# Altium footprint library 400389.PcbLib: 91 footprints (part 3 of 6)
Each footprint in its own frame and in the unit in brackets; x right, y up, seen from the top. Pads: shape width x height; smd on the part's side, far side on the other; paste and mask are expansions set on the pad; w line width, h text height; cw(c..) or ccw(c..) is an arc to the next point about the centre after c.
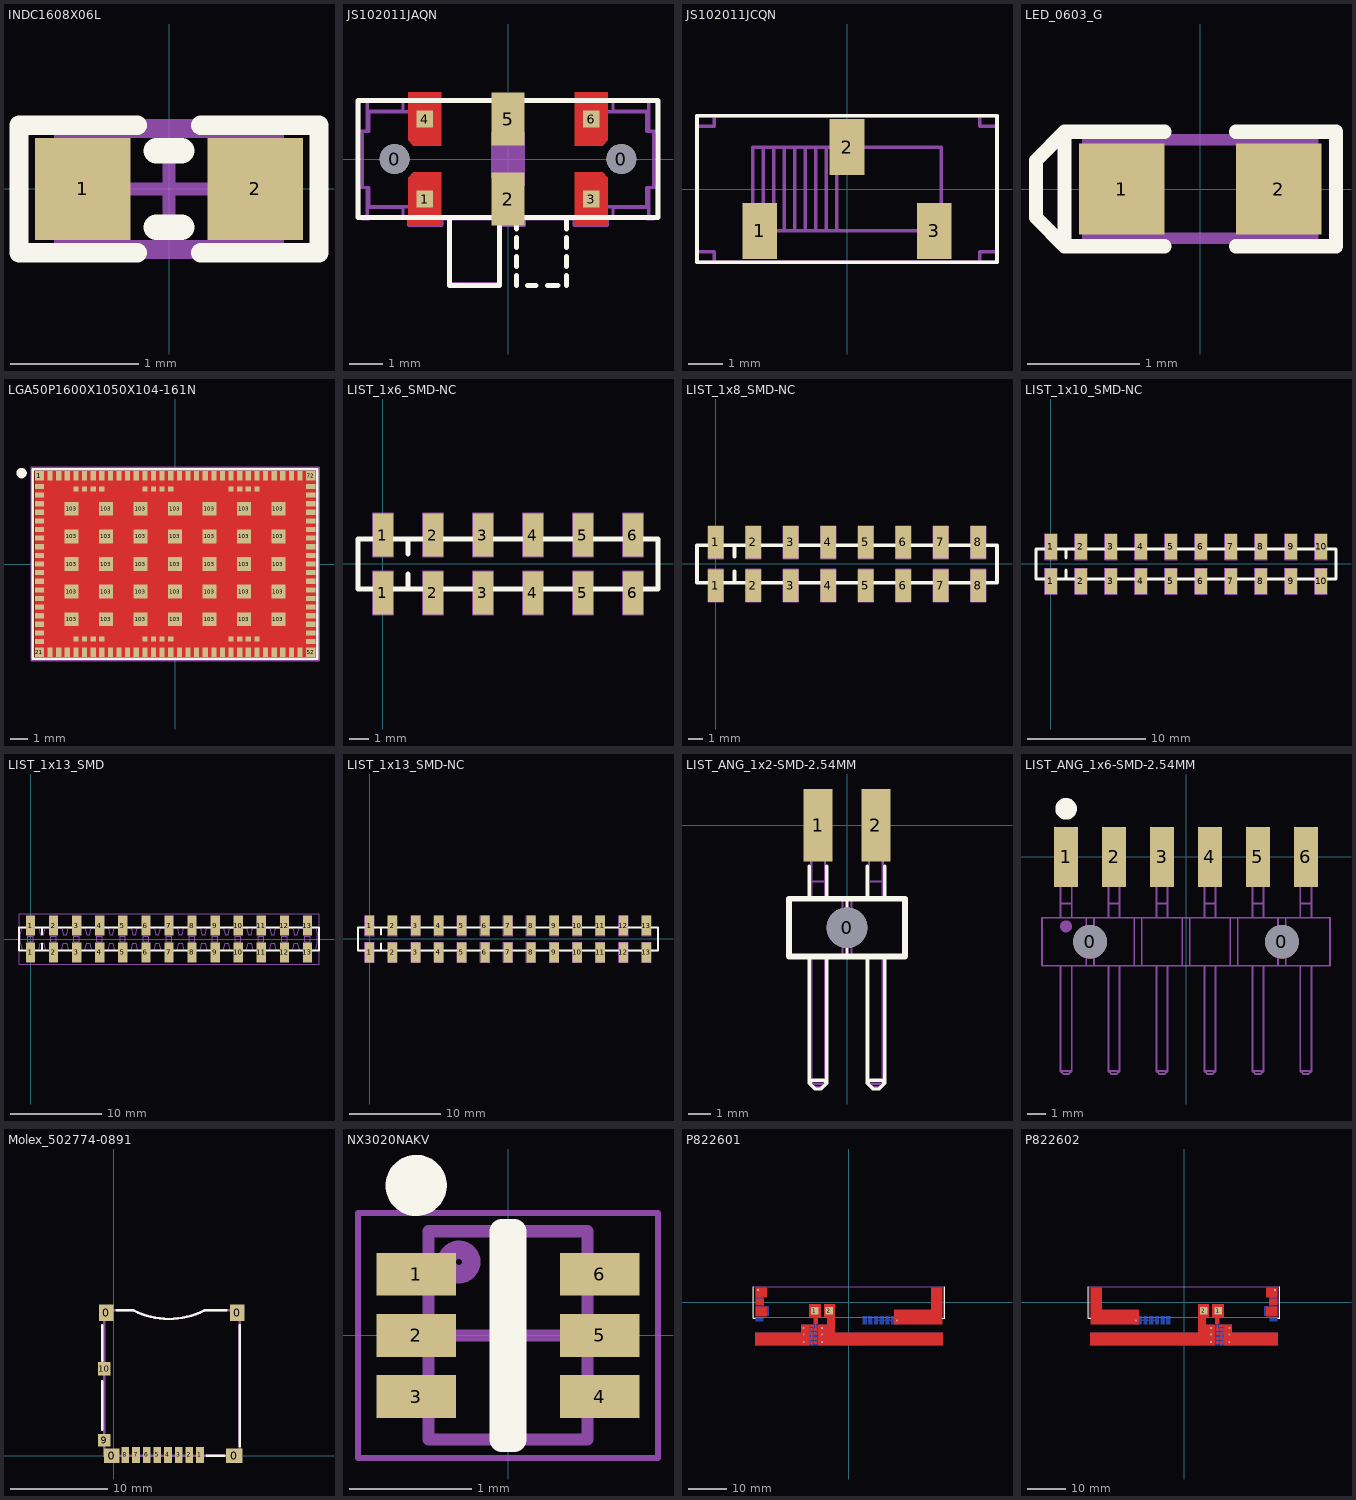
[diagram p2: the footprints below, top view; thin cyan lines are the x and y axes]

## INDC1608X06L [mm]
pads (2):
  rect 0.75x0.8 smd: 1(-0.675,0) 2(0.675,0)
Top Overlay:
  lines w0.152: -0.25,-0.5 -1.175,-0.5 -1.175,0.5 -0.25,0.5 ; 0.25,-0.5 1.175,-0.5 1.175,0.5 0.25,0.5
  lines w0.2: -0.1,-0.3 0.1,-0.3 ; -0.1,0.3 0.1,0.3
Mechanical 7:
  lines w0.1: -0.85,-0.45 0.85,-0.45 0.85,0.45 -0.85,0.45 -0.85,-0.45
  text ".Designator" at -0.711,-0.152 h0.3
Mechanical 15:
  lines w0.1: -0.45,0 0.45,0 ; 0,-0.45 0,0.45 ; -1.175,-0.5 -1.175,0.5 1.175,0.5 1.175,-0.5 -1.175,-0.5
3D body "User Library-Chip Inductor.step": height 0.8, standoff 0, extent -0.8,-0.475 0.8,0.475

## JS102011JAQN [mm]
pads (8):
  round 0.9 hole 0.9 unplated mask+0: 0(-3.4,0) 0(3.4,0)
  rect 0.5x0.5 smd: 1(-2.5,-1.2) 3(2.5,-1.2) 4(-2.5,1.2) 6(2.5,1.2)
  rect 1x1.6 smd: 2(0,-1.2) 5(0,1.2)
Top Layer:
  region: -3,0.562 -2.838,0.4 -2,0.4 -2,2 -3,2
  region: -3,-0.562 -2.838,-0.4 -2,-0.4 -2,-2 -3,-2
  region: 3,0.562 2.838,0.4 2,0.4 2,2 3,2
  region: 3,-0.562 2.838,-0.4 2,-0.4 2,-2 3,-2
Top Overlay:
  lines w0.152: -1.75,-1.75 -1.75,-3.8 -0.25,-3.8 -0.25,-1.75 ; 0.25,-3.8 0.25,-3.5 ; 0.25,-3.22 0.25,-2.92 ; 0.25,-2.66 0.25,-2.36 ; 0.25,-2.1 0.25,-1.75 ; 0.59,-3.8 0.84,-3.8 ; 1.19,-3.8 1.44,-3.8 ; 1.2,-3.8 1.5,-3.8 ; 1.75,-3.8 1.75,-3.5 ; 1.75,-3.22 1.75,-2.92 ; 1.75,-2.66 1.75,-2.36 ; 1.75,-2.1 1.75,-1.75 ; -4.5,-1.75 -4.5,1.75 4.5,1.75 4.5,-1.75 -4.5,-1.75
Mechanical 7:
  region: -0.5,-0.554 -0.254,-0.8 0.5,-0.8 0.5,0.8 -0.5,0.8
  lines w0.1: -4.376,-1.747 -4.376,-1.797 -4.174,-1.797 -4.174,-1.747 ; -4.376,1.731 -4.376,1.781 -4.174,1.781 -4.174,1.731 ; -4.224,-1.747 -4.224,-0.853 ; -4.224,-1.449 -3.151,-1.449 -3.151,-1.747 ; -4.224,0.836 -4.224,1.731 ; -4.224,1.433 -3.151,1.433 -3.151,1.731 ; -2.982,-1.747 -2.982,-1.996 -1.988,-1.996 -1.988,-1.797 ; -2.783,-1.747 -2.783,-1.797 -2.772,-1.797 ; -2.783,1.731 -2.783,1.781 -2.772,1.781 ; -2.772,-1.747 -4.472,-1.747 -4.472,-0.853 -4.376,-0.853 ; -2.772,1.731 -4.472,1.731 -4.472,0.836 -4.376,0.836 ; -1.74,-1.797 -1.74,-3.735 -0.249,-3.735 -0.249,-1.797 ; -0.249,-1.996 0.496,-1.996 0.496,-1.797 ; 1.987,-1.797 1.987,-1.996 2.981,-1.996 2.981,-1.747 ; 2.77,-1.747 4.471,-1.747 4.471,-0.853 4.375,-0.853 ; 2.77,1.731 4.471,1.731 4.471,0.836 4.375,0.836 ; 2.782,-1.747 2.782,-1.797 2.77,-1.797 ; 2.782,1.731 2.782,1.781 2.77,1.781 ; 3.149,-1.747 3.149,-1.449 4.223,-1.449 ; 3.149,1.731 3.149,1.433 4.223,1.433 ; 4.173,-1.747 4.173,-1.797 4.375,-1.797 4.375,-1.747 ; 4.173,1.731 4.173,1.781 4.375,1.781 4.375,1.731 ; 4.223,-1.747 4.223,-0.853 ; 4.223,0.836 4.223,1.731 ; -4.376,-0.853 -4.376,0.836 ; -4.376,-0.853 -4.168,-0.853 -4.168,-1.434 -2.772,-1.434 -2.772,-1.797 ; -4.376,0.836 -4.168,0.836 -4.168,1.418 -2.772,1.418 -2.772,1.781 ; -2.772,-1.797 2.77,-1.797 ; -2.772,1.781 2.77,1.781 ; 2.77,-1.797 2.77,-1.434 4.166,-1.434 4.166,-0.853 4.375,-0.853 ; 2.77,1.781 2.77,1.418 4.166,1.418 4.166,0.836 4.375,0.836 ; 4.375,-0.853 4.375,0.836
  text ".Designator" at -0.9,-0.2 h0.38
3D body "CL-SB-22A-11T.stp": height 3.5, standoff 0, extent -4.25,-3.75 4.25,1.75

## JS102011JCQN [mm]
pads (3):
  rect 1x1.6 smd: 1(-2.5,-1.2) 2(0,1.2) 3(2.5,-1.2)
Top Overlay:
  lines w0.102: -4.3,-2.1 4.3,-2.1 4.3,2.1 -4.3,2.1 -4.3,-2.1
Mechanical 7:
  lines w0.1: -4.3,-1.8 -3.8,-1.8 -3.8,-2.1 ; -4.3,1.8 -3.8,1.8 -3.8,2.1 ; 3.8,-2.1 3.8,-1.8 4.3,-1.8 ; 3.8,2.1 3.8,1.8 4.3,1.8
  lines w0.102: -4.3,-1.8 -4.3,1.8 ; -3.8,-2.1 3.8,-2.1 ; -3.8,2.1 3.8,2.1 ; -2.4,-1.2 -2.4,1.2 ; -2.1,-1.2 -2.1,1.2 ; -1.8,-1.2 -1.8,1.2 ; -1.5,-1.2 -1.5,1.2 ; -1.2,-1.2 -1.2,1.2 ; -0.9,-1.2 -0.9,1.2 ; -0.6,-1.2 -0.6,1.2 ; -0.3,-1.2 -0.3,1.2 ; 4.3,-1.8 4.3,1.8 ; -2.7,-1.2 2.7,-1.2 2.7,1.2 -2.7,1.2 -2.7,-1.2
  text ".Designator" at -1.7,-0.3 h0.76
Mechanical 15:
  lines w0.102: -4.3,-2.1 4.3,-2.1 4.3,2.1 -4.3,2.1 -4.3,-2.1
3D body "js102011jcqn.stp": height 5.22, standoff -0.38, extent -4.25,-2.05 4.25,2.05

## LED_0603_G [mil]
pads (2):
  rect 30x32 smd: 1(-27.5,0) 2(27.5,0)
Top Overlay:
  lines w5: -12.5,-20 -47.5,-20 ; -12.5,20 -47.5,20 ; 12.5,-20 47.5,-20 47.5,20 12.5,20 ; -47.5,-20 -47.5,20 ; -47.5,-20 -57.5,-10 -57.5,10 -47.5,20
Mechanical 7:
  lines w3.94: -27.56,-17.26 -27.56,17.26 ; -23.62,-17.26 -23.62,17.26 ; 23.62,-17.26 23.62,17.26 ; 27.56,-17.26 27.56,17.26 ; -39.37,-17.26 39.37,-17.26 39.37,17.26 -39.37,17.26 -39.37,-17.26
  text ".Designator" at -19.68,-4.92 h12
3D body "User Library-led_0603_green.step": height 23.62, standoff 0, extent -31.63,-15.75 32.15,15.75

## LGA50P1600X1050X104-161N [mm]
pads (161):
  rect 0.54x0.54 smd mask+0.05: 1(-7.87,5.12) 21(-7.87,-5.12) 52(7.87,-5.12) 72(7.87,5.12)
  rect 0.54x0.3 smd mask+0.05: 2(-7.87,4.5) 3(-7.87,4) 4(-7.87,3.5) 5(-7.87,3) 6(-7.87,2.5) 7(-7.87,2) 8(-7.87,1.5) 9(-7.87,1) 10(-7.87,0.5) 11(-7.87,0) 12(-7.87,-0.5) 13(-7.87,-1) 14(-7.87,-1.5) 15(-7.87,-2) 16(-7.87,-2.5) 17(-7.87,-3) 18(-7.87,-3.5) 19(-7.87,-4) 20(-7.87,-4.5) 53(7.87,-4.5) 54(7.87,-4) 55(7.87,-3.5) 56(7.87,-3) 57(7.87,-2.5) 58(7.87,-2) 59(7.87,-1.5) 60(7.87,-1) 61(7.87,-0.5) 62(7.87,0) 63(7.87,0.5) 64(7.87,1) 65(7.87,1.5) 66(7.87,2) 67(7.87,2.5) 68(7.87,3) 69(7.87,3.5) 70(7.87,4) 71(7.87,4.5)
  rect 0.3x0.54 smd mask+0.05: 22(-7.25,-5.12) 23(-6.75,-5.12) 24(-6.25,-5.12) 25(-5.75,-5.12) 26(-5.25,-5.12) 27(-4.75,-5.12) 28(-4.25,-5.12) 29(-3.75,-5.12) 30(-3.25,-5.12) 31(-2.75,-5.12) 32(-2.25,-5.12) 33(-1.75,-5.12) 34(-1.25,-5.12) 35(-0.75,-5.12) 36(-0.25,-5.12) 37(0.25,-5.12) 38(0.75,-5.12) 39(1.25,-5.12) 40(1.75,-5.12) 41(2.25,-5.12) 42(2.75,-5.12) 43(3.25,-5.12) 44(3.75,-5.12) 45(4.25,-5.12) 46(4.75,-5.12) 47(5.25,-5.12) 48(5.75,-5.12) 49(6.25,-5.12) 50(6.75,-5.12) 51(7.25,-5.12) 73(7.25,5.12) 74(6.75,5.12) 75(6.25,5.12) 76(5.75,5.12) 77(5.25,5.12) 78(4.75,5.12) 79(4.25,5.12) 80(3.75,5.12) 81(3.25,5.12) 82(2.75,5.12) 83(2.25,5.12) 84(1.75,5.12) 85(1.25,5.12) 86(0.75,5.12) 87(0.25,5.12) 88(-0.25,5.12) 89(-0.75,5.12) 90(-1.25,5.12) 91(-1.75,5.12) 92(-2.25,5.12) 93(-2.75,5.12) 94(-3.25,5.12) 95(-3.75,5.12) 96(-4.25,5.12) 97(-4.75,5.12) 98(-5.25,5.12) 99(-5.75,5.12) 100(-6.25,5.12) 101(-6.75,5.12) 102(-7.25,5.12)
  rect 0.8x0.8 smd mask+0.05: 103(-6,-3.2) 103(-6,-1.6) 103(-6,0) 103(-6,1.6) 103(-6,3.2) 103(-4,-3.2) 103(-4,-1.6) 103(-4,0) 103(-4,1.6) 103(-4,3.2) 103(-2,-3.2) 103(-2,-1.6) 103(-2,0) 103(-2,1.6) 103(-2,3.2) 103(0,-3.2) 103(0,-1.6) 103(0,0) 103(0,1.6) 103(0,3.2) 103(2,-3.2) 103(2,-1.6) 103(2,0) 103(2,1.6) 103(2,3.2) 103(4,-3.2) 103(4,-1.6) 103(4,0) 103(4,1.6) 103(4,3.2) 103(6,-3.2) 103(6,-1.6) 103(6,0) 103(6,1.6) 103(6,3.2)
  rect 0.3x0.3 smd mask+0.05: 104(-5.75,-4.35) 105(-5.25,-4.35) 106(-4.75,-4.35) 107(-4.25,-4.35) 108(-1.75,-4.35) 109(-1.25,-4.35) 110(-0.75,-4.35) 111(-0.25,-4.35) 112(3.25,-4.35) 113(3.75,-4.35) 114(4.25,-4.35) 115(4.75,-4.35) 116(4.75,4.35) 117(4.25,4.35) 118(3.75,4.35) 119(3.25,4.35) 120(-0.25,4.35) 121(-0.75,4.35) 122(-1.25,4.35) 123(-1.75,4.35) 124(-4.25,4.35) 125(-4.75,4.35) 126(-5.25,4.35) 127(-5.75,4.35)
Top Layer:
  pour cut-out: -8.15,5.4 8.15,5.4 8.15,-5.4 -8.15,-5.4
Top Overlay:
  circle w0.3: c-8.904,5.274 r0.15
  lines w0.15: -8.25,-5.5 -8.25,5.5 8.25,5.5 8.25,-5.5 -8.25,-5.5
Mechanical 7:
  circle w0.3: c-6.5,3.75 r0.15
  lines w0.1: -8.05,-5.3 -8.05,5.3 8.05,5.3 8.05,-5.3 -8.05,-5.3
  text ".Designator" at 0.5,-0.1 h0.38
Mechanical 15:
  circle w0.3: c-6.5,3.75 r0.15
  lines w0.1: -8.35,-5.6 8.35,-5.6 8.35,5.6 -8.35,5.6 -8.35,-5.6
3D body "nRF9160_v5.step": height 1.2, standoff 0, extent -8.05,-5.3 8.05,5.3

## LIST_1x6_SMD-NC [mm]
pads (12):
  rect 1.02x2.19 smd: 1(0,-1.465) 1(0,1.465) 2(2.54,-1.465) 2(2.54,1.465) 3(5.08,-1.465) 3(5.08,1.465) 4(7.62,-1.465) 4(7.62,1.465) 5(10.16,-1.465) 5(10.16,1.465) 6(12.7,-1.465) 6(12.7,1.465)
Top Overlay:
  lines w0.254: 1.27,-1.27 1.27,-0.508 ; 1.27,0.508 1.27,1.27 ; -1.27,-1.27 -1.27,1.27 13.97,1.27 13.97,-1.27 -1.27,-1.27
Mechanical 7:
  lines w0.1: -0.686,-1.27 -1.27,-1.27 -1.27,1.27 -0.686,1.27 ; 0.686,-1.27 1.854,-1.27 ; 0.686,1.27 1.854,1.27 ; 1.27,-1.27 1.27,-0.508 ; 1.27,0.508 1.27,1.27 ; 3.226,-1.27 4.394,-1.27 ; 3.226,1.27 4.394,1.27 ; 5.766,-1.27 6.934,-1.27 ; 5.766,1.27 6.934,1.27 ; 8.306,-1.27 9.474,-1.27 ; 8.306,1.27 9.474,1.27 ; 10.846,-1.27 12.014,-1.27 ; 10.846,1.27 12.014,1.27 ; 13.386,-1.27 13.97,-1.27 13.97,1.27 13.386,1.27 ; -0.51,-2.56 -0.51,-0.37 0.51,-0.37 0.51,-2.56 -0.51,-2.56 ; -0.51,0.37 0.51,0.37 0.51,2.56 -0.51,2.56 -0.51,0.37 ; 2.03,-2.56 2.03,-0.37 3.05,-0.37 3.05,-2.56 2.03,-2.56 ; 2.03,0.37 2.03,2.56 3.05,2.56 3.05,0.37 2.03,0.37 ; 4.57,-2.56 4.57,-0.37 5.59,-0.37 5.59,-2.56 4.57,-2.56 ; 4.57,0.37 4.57,2.56 5.59,2.56 5.59,0.37 4.57,0.37 ; 7.11,-2.56 7.11,-0.37 8.13,-0.37 8.13,-2.56 7.11,-2.56 ; 7.11,0.37 7.11,2.56 8.13,2.56 8.13,0.37 7.11,0.37 ; 9.65,-2.56 9.65,-0.37 10.67,-0.37 10.67,-2.56 9.65,-2.56 ; 9.65,0.37 9.65,2.56 10.67,2.56 10.67,0.37 9.65,0.37 ; 12.19,-2.56 12.19,-0.37 13.21,-0.37 13.21,-2.56 12.19,-2.56 ; 12.19,0.37 12.19,2.56 13.21,2.56 13.21,0.37 12.19,0.37
  text ".Designator" at 0.5,-0.2 h0.38

## LIST_1x8_SMD-NC [mm]
pads (16):
  rect 1.02x2.19 smd: 1(0,-1.465) 1(0,1.465) 2(2.54,-1.465) 2(2.54,1.465) 3(5.08,-1.465) 3(5.08,1.465) 4(7.62,-1.465) 4(7.62,1.465) 5(10.16,-1.465) 5(10.16,1.465) 6(12.7,-1.465) 6(12.7,1.465) 7(15.24,-1.465) 7(15.24,1.465) 8(17.78,-1.465) 8(17.78,1.465)
Top Overlay:
  lines w0.254: 1.27,-1.27 1.27,-0.508 ; 1.27,0.508 1.27,1.27 ; -1.27,-1.27 19.05,-1.27 19.05,1.27 -1.27,1.27 -1.27,-1.27
Mechanical 7:
  lines w0.1: -0.686,-1.27 -1.27,-1.27 -1.27,1.27 -0.686,1.27 ; 0.686,-1.27 1.854,-1.27 ; 0.686,1.27 1.854,1.27 ; 1.27,-1.27 1.27,-0.508 ; 1.27,0.508 1.27,1.27 ; 3.226,-1.27 4.394,-1.27 ; 3.226,1.27 4.394,1.27 ; 5.766,-1.27 6.934,-1.27 ; 5.766,1.27 6.934,1.27 ; 8.306,-1.27 9.474,-1.27 ; 8.306,1.27 9.474,1.27 ; 10.846,-1.27 12.014,-1.27 ; 10.846,1.27 12.014,1.27 ; 13.386,-1.27 14.554,-1.27 ; 13.386,1.27 14.554,1.27 ; 15.926,-1.27 17.094,-1.27 ; 15.926,1.27 17.094,1.27 ; 18.466,-1.27 19.05,-1.27 19.05,1.27 18.466,1.27 ; -0.51,-2.56 0.51,-2.56 0.51,-0.37 -0.51,-0.37 -0.51,-2.56 ; -0.51,0.37 -0.51,2.56 0.51,2.56 0.51,0.37 -0.51,0.37 ; 2.03,-2.56 3.05,-2.56 3.05,-0.37 2.03,-0.37 2.03,-2.56 ; 2.03,0.37 3.05,0.37 3.05,2.56 2.03,2.56 2.03,0.37 ; 4.57,-2.56 5.59,-2.56 5.59,-0.37 4.57,-0.37 4.57,-2.56 ; 4.57,0.37 5.59,0.37 5.59,2.56 4.57,2.56 4.57,0.37 ; 7.11,-2.56 8.13,-2.56 8.13,-0.37 7.11,-0.37 7.11,-2.56 ; 7.11,0.37 8.13,0.37 8.13,2.56 7.11,2.56 7.11,0.37 ; 9.65,-2.56 10.67,-2.56 10.67,-0.37 9.65,-0.37 9.65,-2.56 ; 9.65,0.37 10.67,0.37 10.67,2.56 9.65,2.56 9.65,0.37 ; 12.19,-2.56 13.21,-2.56 13.21,-0.37 12.19,-0.37 12.19,-2.56 ; 12.19,0.37 13.21,0.37 13.21,2.56 12.19,2.56 12.19,0.37 ; 14.73,-2.56 15.75,-2.56 15.75,-0.37 14.73,-0.37 14.73,-2.56 ; 14.73,0.37 15.75,0.37 15.75,2.56 14.73,2.56 14.73,0.37 ; 17.27,-2.56 18.29,-2.56 18.29,-0.37 17.27,-0.37 17.27,-2.56 ; 17.27,0.37 18.29,0.37 18.29,2.56 17.27,2.56 17.27,0.37
  text ".Designator" at 0.5,-0.2 h0.38

## LIST_1x10_SMD-NC [mm]
pads (20):
  rect 1.02x2.19 smd: 1(0,-1.465) 1(0,1.465) 2(2.54,-1.465) 2(2.54,1.465) 3(5.08,-1.465) 3(5.08,1.465) 4(7.62,-1.465) 4(7.62,1.465) 5(10.16,-1.465) 5(10.16,1.465) 6(12.7,-1.465) 6(12.7,1.465) 7(15.24,-1.465) 7(15.24,1.465) 8(17.78,-1.465) 8(17.78,1.465) 9(20.32,-1.465) 9(20.32,1.465) 10(22.86,-1.465) 10(22.86,1.465)
Top Overlay:
  lines w0.254: 1.27,-1.27 1.27,-0.508 ; 1.27,0.508 1.27,1.27 ; -1.27,-1.27 -1.27,1.27 24.13,1.27 24.13,-1.27 -1.27,-1.27
Mechanical 7:
  lines w0.1: -0.686,-1.27 -1.27,-1.27 -1.27,1.27 -0.686,1.27 ; 0.686,-1.27 1.854,-1.27 ; 0.686,1.27 1.854,1.27 ; 1.27,-1.27 1.27,-0.508 ; 1.27,0.508 1.27,1.27 ; 3.226,-1.27 4.394,-1.27 ; 3.226,1.27 4.394,1.27 ; 5.766,-1.27 6.934,-1.27 ; 5.766,1.27 6.934,1.27 ; 8.306,-1.27 9.474,-1.27 ; 8.306,1.27 9.474,1.27 ; 10.846,-1.27 12.014,-1.27 ; 10.846,1.27 12.014,1.27 ; 13.386,-1.27 14.554,-1.27 ; 13.386,1.27 14.554,1.27 ; 15.926,-1.27 17.094,-1.27 ; 15.926,1.27 17.094,1.27 ; 18.466,-1.27 19.634,-1.27 ; 18.466,1.27 19.634,1.27 ; 21.006,-1.27 22.174,-1.27 ; 21.006,1.27 22.174,1.27 ; 23.546,-1.27 24.13,-1.27 24.13,1.27 23.546,1.27 ; -0.51,-2.56 -0.51,-0.37 0.51,-0.37 0.51,-2.56 -0.51,-2.56 ; -0.51,0.37 0.51,0.37 0.51,2.56 -0.51,2.56 -0.51,0.37 ; 2.03,-2.56 2.03,-0.37 3.05,-0.37 3.05,-2.56 2.03,-2.56 ; 2.03,0.37 2.03,2.56 3.05,2.56 3.05,0.37 2.03,0.37 ; 4.57,-2.56 4.57,-0.37 5.59,-0.37 5.59,-2.56 4.57,-2.56 ; 4.57,0.37 4.57,2.56 5.59,2.56 5.59,0.37 4.57,0.37 ; 7.11,-2.56 7.11,-0.37 8.13,-0.37 8.13,-2.56 7.11,-2.56 ; 7.11,0.37 7.11,2.56 8.13,2.56 8.13,0.37 7.11,0.37 ; 9.65,-2.56 9.65,-0.37 10.67,-0.37 10.67,-2.56 9.65,-2.56 ; 9.65,0.37 9.65,2.56 10.67,2.56 10.67,0.37 9.65,0.37 ; 12.19,-2.56 12.19,-0.37 13.21,-0.37 13.21,-2.56 12.19,-2.56 ; 12.19,0.37 12.19,2.56 13.21,2.56 13.21,0.37 12.19,0.37 ; 14.73,-2.56 14.73,-0.37 15.75,-0.37 15.75,-2.56 14.73,-2.56 ; 14.73,0.37 14.73,2.56 15.75,2.56 15.75,0.37 14.73,0.37 ; 17.27,-2.56 17.27,-0.37 18.29,-0.37 18.29,-2.56 17.27,-2.56 ; 17.27,0.37 17.27,2.56 18.29,2.56 18.29,0.37 17.27,0.37 ; 19.81,-2.56 20.83,-2.56 20.83,-0.37 19.81,-0.37 19.81,-2.56 ; 19.81,0.37 20.83,0.37 20.83,2.56 19.81,2.56 19.81,0.37 ; 22.35,-2.56 23.37,-2.56 23.37,-0.37 22.35,-0.37 22.35,-2.56 ; 22.35,0.37 23.37,0.37 23.37,2.56 22.35,2.56 22.35,0.37
  text ".Designator" at 0.5,-0.2 h0.38

## LIST_1x13_SMD [mm]
pads (26):
  rect 1.02x2.19 smd: 1(0,-1.465) 1(0,1.465) 2(2.54,-1.465) 2(2.54,1.465) 3(5.08,-1.465) 3(5.08,1.465) 4(7.62,-1.465) 4(7.62,1.465) 5(10.16,-1.465) 5(10.16,1.465) 6(12.7,-1.465) 6(12.7,1.465) 7(15.24,-1.465) 7(15.24,1.465) 8(17.78,-1.465) 8(17.78,1.465) 9(20.32,-1.465) 9(20.32,1.465) 10(22.86,-1.465) 10(22.86,1.465) 11(25.4,-1.465) 11(25.4,1.465) 12(27.94,-1.465) 12(27.94,1.465) 13(30.48,-1.465) 13(30.48,1.465)
Top Overlay:
  lines w0.254: 1.27,-1.27 1.27,-0.508 ; 1.27,0.508 1.27,1.27 ; -1.27,-1.27 31.75,-1.27 31.75,1.27 -1.27,1.27 -1.27,-1.27
Mechanical 7:
  drawing of 195 lines, arcs and shapes, not listed
  text ".Designator" at 0.5,-0.2 h0.38
Mechanical 15:
  lines w0.1: -1.27,-2.8 -1.27,2.8 31.75,2.8 31.75,-2.8 -1.27,-2.8
3D body "pin_header_a-sl254-eg-g13mp1.stp": height 9.82, standoff -0.02, extent -1.27,-2.5 31.75,2.5

## LIST_1x13_SMD-NC [mm]
pads (26):
  rect 1.02x2.19 smd: 1(0,-1.465) 1(0,1.465) 2(2.54,-1.465) 2(2.54,1.465) 3(5.08,-1.465) 3(5.08,1.465) 4(7.62,-1.465) 4(7.62,1.465) 5(10.16,-1.465) 5(10.16,1.465) 6(12.7,-1.465) 6(12.7,1.465) 7(15.24,-1.465) 7(15.24,1.465) 8(17.78,-1.465) 8(17.78,1.465) 9(20.32,-1.465) 9(20.32,1.465) 10(22.86,-1.465) 10(22.86,1.465) 11(25.4,-1.465) 11(25.4,1.465) 12(27.94,-1.465) 12(27.94,1.465) 13(30.48,-1.465) 13(30.48,1.465)
Top Overlay:
  lines w0.254: 1.27,-1.27 1.27,-0.508 ; 1.27,0.508 1.27,1.27 ; -1.27,-1.27 31.75,-1.27 31.75,1.27 -1.27,1.27 -1.27,-1.27
Mechanical 7:
  lines w0.1: -0.686,-1.27 -1.27,-1.27 -1.27,1.27 -0.686,1.27 ; 0.686,-1.27 1.854,-1.27 ; 0.686,1.27 1.854,1.27 ; 1.27,-1.27 1.27,-0.508 ; 1.27,0.508 1.27,1.27 ; 3.226,-1.27 4.394,-1.27 ; 3.226,1.27 4.394,1.27 ; 5.766,-1.27 6.934,-1.27 ; 5.766,1.27 6.934,1.27 ; 8.306,-1.27 9.474,-1.27 ; 8.306,1.27 9.474,1.27 ; 10.846,-1.27 12.014,-1.27 ; 10.846,1.27 12.014,1.27 ; 13.386,-1.27 14.554,-1.27 ; 13.386,1.27 14.554,1.27 ; 15.926,-1.27 17.094,-1.27 ; 15.926,1.27 17.094,1.27 ; 18.466,-1.27 19.634,-1.27 ; 18.466,1.27 19.634,1.27 ; 21.006,-1.27 22.174,-1.27 ; 21.006,1.27 22.174,1.27 ; 23.546,-1.27 24.714,-1.27 ; 23.546,1.27 24.714,1.27 ; 26.086,-1.27 27.254,-1.27 ; 26.086,1.27 27.254,1.27 ; 28.626,-1.27 29.794,-1.27 ; 28.626,1.27 29.794,1.27 ; 31.166,-1.27 31.75,-1.27 31.75,1.27 31.166,1.27 ; -0.51,-2.56 0.51,-2.56 0.51,-0.37 -0.51,-0.37 -0.51,-2.56 ; -0.51,0.37 -0.51,2.56 0.51,2.56 0.51,0.37 -0.51,0.37 ; 2.03,-2.56 3.05,-2.56 3.05,-0.37 2.03,-0.37 2.03,-2.56 ; 2.03,0.37 3.05,0.37 3.05,2.56 2.03,2.56 2.03,0.37 ; 4.57,-2.56 5.59,-2.56 5.59,-0.37 4.57,-0.37 4.57,-2.56 ; 4.57,0.37 5.59,0.37 5.59,2.56 4.57,2.56 4.57,0.37 ; 7.11,-2.56 8.13,-2.56 8.13,-0.37 7.11,-0.37 7.11,-2.56 ; 7.11,0.37 8.13,0.37 8.13,2.56 7.11,2.56 7.11,0.37 ; 9.65,-2.56 10.67,-2.56 10.67,-0.37 9.65,-0.37 9.65,-2.56 ; 9.65,0.37 10.67,0.37 10.67,2.56 9.65,2.56 9.65,0.37 ; 12.19,-2.56 13.21,-2.56 13.21,-0.37 12.19,-0.37 12.19,-2.56 ; 12.19,0.37 13.21,0.37 13.21,2.56 12.19,2.56 12.19,0.37 ; 14.73,-2.56 15.75,-2.56 15.75,-0.37 14.73,-0.37 14.73,-2.56 ; 14.73,0.37 15.75,0.37 15.75,2.56 14.73,2.56 14.73,0.37 ; 17.27,-2.56 18.29,-2.56 18.29,-0.37 17.27,-0.37 17.27,-2.56 ; 17.27,0.37 18.29,0.37 18.29,2.56 17.27,2.56 17.27,0.37 ; 19.81,-2.56 19.81,-0.37 20.83,-0.37 20.83,-2.56 19.81,-2.56 ; 19.81,0.37 19.81,2.56 20.83,2.56 20.83,0.37 19.81,0.37 ; 22.35,-2.56 22.35,-0.37 23.37,-0.37 23.37,-2.56 22.35,-2.56 ; 22.35,0.37 22.35,2.56 23.37,2.56 23.37,0.37 22.35,0.37 ; 24.89,-2.56 24.89,-0.37 25.91,-0.37 25.91,-2.56 24.89,-2.56 ; 24.89,0.37 24.89,2.56 25.91,2.56 25.91,0.37 24.89,0.37 ; 27.43,-2.56 27.43,-0.37 28.45,-0.37 28.45,-2.56 27.43,-2.56 ; 27.43,0.37 27.43,2.56 28.45,2.56 28.45,0.37 27.43,0.37 ; 29.97,-2.56 30.99,-2.56 30.99,-0.37 29.97,-0.37 29.97,-2.56 ; 29.97,0.37 30.99,0.37 30.99,2.56 29.97,2.56 29.97,0.37
  text ".Designator" at 0.5,-0.2 h0.38

## LIST_ANG_1x2-SMD-2.54MM [mm]
pads (3):
  round 1.78 hole 1.78 unplated: 0(0,-4.496)
  rect 1.27x3.18 smd: 1(-1.27,0) 2(1.27,0)
Top Overlay:
  lines w0.15: -1.651,-5.766 -1.651,-11.324 ; -1.651,-3.226 -1.651,-1.8 ; -0.889,-5.766 -0.889,-11.324 ; -0.889,-3.226 -0.889,-1.8 ; 0,-5.766 0,-3.226 ; 0.889,-5.766 0.889,-11.324 ; 0.889,-3.226 0.889,-1.8 ; 1.651,-5.766 1.651,-11.324 ; 1.651,-3.226 1.651,-1.8 ; -1.651,-11.324 -1.524,-11.197 -1.016,-11.197 -0.889,-11.324 ; -1.651,-11.324 -1.397,-11.578 -1.143,-11.578 -0.889,-11.324 ; 0.889,-11.324 1.016,-11.197 1.524,-11.197 1.651,-11.324 ; 0.889,-11.324 1.143,-11.578 1.397,-11.578 1.651,-11.324
  lines w0.254: -2.54,-5.766 2.54,-5.766 2.54,-3.226 -2.54,-3.226 -2.54,-5.766
Mechanical 7:
  lines w0.1: -1.57,-5.766 -1.57,-11.347 ; -1.57,-3.226 -1.57,0.85 ; -1.57,-2.466 -0.97,-2.466 ; -1.57,-0.464 -0.97,-0.464 ; -0.97,-5.766 -0.97,-11.347 ; -0.97,-3.226 -0.97,0.85 ; -0.2,-5.766 -0.2,-3.226 ; 0.2,-5.766 0.2,-3.226 ; 0.97,-5.766 0.97,-11.347 ; 0.97,-3.226 0.97,0.85 ; 0.97,-2.466 1.57,-2.466 ; 0.97,-0.464 1.57,-0.464 ; 1.57,-5.766 1.57,-11.347 ; 1.57,-3.226 1.57,0.85 ; -1.57,-11.347 -1.42,-11.497 -1.12,-11.497 -0.97,-11.347 ; -1.57,-11.347 -0.97,-11.347 ; -1.57,0.85 -1.42,1 -1.12,1 -0.97,0.85 ; -1.57,0.85 -0.97,0.85 ; 0.97,-11.347 1.12,-11.497 1.42,-11.497 1.57,-11.347 ; 0.97,-11.347 1.57,-11.347 ; 0.97,0.85 1.12,1 1.42,1 1.57,0.85 ; 0.97,0.85 1.57,0.85 ; -2.54,-5.766 2.54,-5.766 2.54,-3.226 -2.54,-3.226 -2.54,-5.766
  text ".Designator" at -2,-4.7 h0.38
3D body "Samtec-TSM-102-01-L-SH-A.step": height 3.03, standoff -1.41, extent -2.56,-11.605 2.52,1.349

## LIST_ANG_1x6-SMD-2.54MM [mm]
pads (8):
  round 1.78 hole 1.78 unplated: 0(-5.08,-4.496) 0(5.08,-4.496)
  rect 1.27x3.18 smd: 1(-6.35,0) 2(-3.81,0) 3(-1.27,0) 4(1.27,0) 5(3.81,0) 6(6.35,0)
Top Overlay:
  circle w0.635: c-6.35,2.54 r0.254
Mechanical 7:
  circle w0.381: c-6.35,-3.683 r0.127
  lines w0.1: -6.65,-5.766 -6.65,-11.347 ; -6.65,-3.226 -6.65,0.85 ; -6.65,-2.466 -6.05,-2.466 ; -6.65,-0.464 -6.05,-0.464 ; -6.05,-5.766 -6.05,-11.347 ; -6.05,-3.226 -6.05,0.85 ; -5.28,-5.766 -5.28,-3.226 ; -4.88,-5.766 -4.88,-3.226 ; -4.11,-5.766 -4.11,-11.347 ; -4.11,-3.226 -4.11,0.85 ; -4.11,-2.466 -3.51,-2.466 ; -4.11,-0.464 -3.51,-0.464 ; -3.51,-5.766 -3.51,-11.347 ; -3.51,-3.226 -3.51,0.85 ; -2.74,-5.766 -2.74,-3.226 ; -2.34,-5.766 -2.34,-3.226 ; -1.57,-5.766 -1.57,-11.347 ; -1.57,-3.226 -1.57,0.85 ; -1.57,-2.466 -0.97,-2.466 ; -1.57,-0.464 -0.97,-0.464 ; -0.97,-5.766 -0.97,-11.347 ; -0.97,-3.226 -0.97,0.85 ; -0.2,-5.766 -0.2,-3.226 ; 0.2,-5.766 0.2,-3.226 ; 0.97,-5.766 0.97,-11.347 ; 0.97,-3.226 0.97,0.85 ; 0.97,-2.466 1.57,-2.466 ; 0.97,-0.464 1.57,-0.464 ; 1.57,-5.766 1.57,-11.347 ; 1.57,-3.226 1.57,0.85 ; 2.34,-5.766 2.34,-3.226 ; 2.74,-5.766 2.74,-3.226 ; 3.51,-5.766 3.51,-11.347 ; 3.51,-3.226 3.51,0.85 ; 3.51,-2.466 4.11,-2.466 ; 3.51,-0.464 4.11,-0.464 ; 4.11,-5.766 4.11,-11.347 ; 4.11,-3.226 4.11,0.85 ; 4.88,-5.766 4.88,-3.226 ; 5.28,-5.766 5.28,-3.226 ; 6.05,-5.766 6.05,-11.347 ; 6.05,-3.226 6.05,0.85 ; 6.05,-2.466 6.65,-2.466 ; 6.05,-0.464 6.65,-0.464 ; 6.65,-5.766 6.65,-11.347 ; 6.65,-3.226 6.65,0.85 ; -6.65,-11.347 -6.5,-11.497 -6.2,-11.497 -6.05,-11.347 ; -6.65,-11.347 -6.05,-11.347 ; -6.65,0.85 -6.5,1 -6.2,1 -6.05,0.85 ; -6.65,0.85 -6.05,0.85 ; -4.11,-11.347 -3.96,-11.497 -3.66,-11.497 -3.51,-11.347 ; -4.11,-11.347 -3.51,-11.347 ; -4.11,0.85 -3.96,1 -3.66,1 -3.51,0.85 ; -4.11,0.85 -3.51,0.85 ; -1.57,-11.347 -1.42,-11.497 -1.12,-11.497 -0.97,-11.347 ; -1.57,-11.347 -0.97,-11.347 ; -1.57,0.85 -1.42,1 -1.12,1 -0.97,0.85 ; -1.57,0.85 -0.97,0.85 ; 0.97,-11.347 1.12,-11.497 1.42,-11.497 1.57,-11.347 ; 0.97,-11.347 1.57,-11.347 ; 0.97,0.85 1.12,1 1.42,1 1.57,0.85 ; 0.97,0.85 1.57,0.85 ; 3.51,-11.347 3.66,-11.497 3.96,-11.497 4.11,-11.347 ; 3.51,-11.347 4.11,-11.347 ; 3.51,0.85 3.66,1 3.96,1 4.11,0.85 ; 3.51,0.85 4.11,0.85 ; 6.05,-11.347 6.65,-11.347 ; 6.05,-11.347 6.2,-11.497 6.5,-11.497 6.65,-11.347 ; 6.05,0.85 6.65,0.85 ; 6.05,0.85 6.2,1 6.5,1 6.65,0.85 ; -7.62,-5.766 7.62,-5.766 7.62,-3.226 -7.62,-3.226 -7.62,-5.766
  text ".Designator" at -7.08,-4.7 h0.38

## Molex_502774-0891 [mm]
pads (14):
  rect 1.5x1.7 smd mask+0.05: 0(-0.75,14.77) 0(12.75,14.77)
  rect 1.6x1.5 smd mask+0.05: 0(-0.21,0)
  rect 1.7x1.5 smd mask+0.05: 0(12.45,0)
  rect 0.8x1.68 smd mask+0.05: 1(8.9,0.08) 2(7.8,0.08) 3(6.7,0.08) 4(5.6,0.08) 5(4.5,0.08) 6(3.4,0.08) 7(2.3,0.08) 8(1.2,0.08)
  rect 1.29x1.3 smd mask+0.05: 9(-0.96,1.6)
  rect 1.29x1.4 smd mask+0.05: 10(-0.96,8.97)
Top Overlay:
  lines w0.254: -1.2,2.7 -1.2,7.7 ; -1.2,9.8 -1.2,13.5 ; 0.3,14.999 2,15 ; 2.091,14.981 ccw(c5.705,22.118) 9.311,14.977 ; 9.4,15 11.6,15 ; 9.6,0 11.4,0 ; 13,1 13,13.5
Mechanical 7:
  lines w0.254: 2.072,15 -1,15 -1,0 13,0 13,15 9.334,15 ; 2.091,14.981 ccw(c5.705,22.118) 9.311,14.977
  text ".designator" at 3.8,6.9 h1.52

## NX3020NAKV [mm]
pads (6):
  rect 0.65x0.35 smd: 1(-0.75,0.5) 2(-0.75,0) 3(-0.75,-0.5) 4(0.75,-0.5) 5(0.75,0) 6(0.75,0.5)
Top Overlay:
  circle w0.25: c-0.75,1.225 r0.125
  lines w0.2: -0.05,-0.85 0.05,-0.85 0.05,0.85 -0.05,0.85 -0.05,-0.85
Mechanical 7:
  circle w0.15: c-0.4,0.6 r0.1
  lines w0.1: -0.65,-0.85 -0.65,0.85 0.65,0.85 0.65,-0.85 -0.65,-0.85
  text ".Designator" at 0,0 h0.3
Mechanical 13:
  lines w0.1: -0.65,-0.85 -0.65,0.85 0.65,0.85 0.65,-0.85 -0.65,-0.85
Mechanical 15:
  lines w0.05: -1.225,-1 -1.225,1 1.225,1 1.225,-1 -1.225,-1
  lines w0.1: -0.5,0 0.5,0 ; 0,-0.5 0,0.5
3D body "NX3020NAKV2.step": height 0.6, standoff 0, extent -0.8,-0.848 0.8,0.848

## P822601 [mm]
pads (2):
  rect 2x2 smd: 1(-8.89,-2.286) 2(-5.08,-2.286)
via -11.886,-6.746 diameter 0.5 hole 0.25
via -7.05,-6.746 diameter 0.5 hole 0.25
via -23.85,3.254 diameter 0.5 hole 0.25
via 12.7,-4.796 diameter 0.5 hole 0.25
via -11.84,-8.55 diameter 0.5 hole 0.25
via -7.05,-8.55 diameter 0.5 hole 0.25
via -11.84,-10.466 diameter 0.5 hole 0.25
via -7.05,-10.466 diameter 0.5 hole 0.25
Top Layer:
  region: -8.45,-8.196 -8.95,-8.196 -8.95,-7.996 -8.45,-7.996
  region: -9.45,-8.196 -9.95,-8.196 -9.95,-7.996 -9.45,-7.996
  region: -8.45,-8.396 -9.95,-8.396 -9.95,-8.196 -8.45,-8.196
  region: -8.45,-8.596 -8.95,-8.596 -8.95,-8.396 -8.45,-8.396
  region: -9.45,-8.596 -9.95,-8.596 -9.95,-8.396 -9.45,-8.396
  region: -9.6,-9.196 -9.8,-9.196 -9.8,-8.596 -9.6,-8.596
  region: -8.45,-9.396 -8.95,-9.396 -8.95,-9.196 -8.45,-9.196
  region: -9.45,-9.396 -9.95,-9.396 -9.95,-9.196 -9.45,-9.196
  region: -8.45,-9.596 -9.95,-9.596 -9.95,-9.396 -8.45,-9.396
  region: -8.45,-9.796 -8.95,-9.796 -8.95,-9.596 -8.45,-9.596
  region: -9.45,-9.796 -9.95,-9.796 -9.95,-9.596 -9.45,-9.596
  region: -21.6,1.254 -24.5,1.254 -24.5,3.754 -21.6,3.754
  region: -22.4,-0.846 -24.5,-0.846 -24.5,0.854 -22.4,0.854
  region: -21.6,-3.746 -24.5,-3.746 -24.5,-1.246 -21.6,-1.246
  region: 24.6,-5.796 12.05,-5.796 12.05,-2.046 24.6,-2.046
  region: 24.6,-2.046 21.7,-2.046 21.7,3.754 24.6,3.754
  region: -3.67,-7.991 -8.05,-7.991 -8.05,-5.996 -3.67,-5.996
  region: -3.67,-5.996 -5.71,-5.996 -5.71,-3.826 -3.67,-3.826
  region: -3.67,-3.826 -6.399,-3.826 -6.4,-0.566 -3.67,-0.566
  region: -10.45,-7.996 -12.45,-7.996 -12.45,-6.496 -10.45,-6.496
  region: -9.2,-6.496 -12.45,-6.496 -12.45,-5.996 -9.2,-5.996
  region: -9.45,-7.496 -9.95,-7.496 -9.95,-7.296 -9.45,-7.296
  region: -8.45,-7.496 -8.95,-7.496 -8.95,-7.296 -8.45,-7.296
  region: -8.45,-7.296 -9.95,-7.296 -9.95,-7.096 -8.45,-7.096
  region: -9.45,-7.096 -9.95,-7.096 -9.95,-6.896 -9.45,-6.896
  region: -8.45,-7.096 -8.95,-7.096 -8.95,-6.896 -8.45,-6.896
  region: -8.6,-6.896 -8.8,-6.896 -8.8,-5.696 -8.6,-5.696
  region: -8.2,-5.696 -9.2,-5.696 -9.2,-3.796 -8.2,-3.796
  region: -7.3,-3.796 -10.4,-3.796 -10.4,-0.596 -7.3,-0.596
  region: -9.6,-11.296 -9.8,-11.296 -9.8,-10.896 -9.6,-10.896
  region: -9.45,-10.896 -9.95,-10.896 -9.95,-10.696 -9.45,-10.696
  region: -8.45,-10.896 -8.95,-10.896 -8.95,-10.696 -8.45,-10.696
  region: -8.45,-10.696 -9.95,-10.696 -9.95,-10.496 -8.45,-10.496
  region: -9.45,-10.496 -9.95,-10.496 -9.95,-10.296 -9.45,-10.296
  region: -8.45,-10.496 -8.95,-10.496 -8.95,-10.296 -8.45,-10.296
  region: 24.75,-11.296 -8.05,-11.296 -8.05,-8.001 24.75,-8.001
  region: -10.45,-11.296 -24.65,-11.296 -24.65,-7.996 -10.45,-7.996
Bottom Layer:
  region: -22.5,-3.546 -24.5,-3.546 -24.5,-2.546 -22.5,-2.546
  region: -24.196,-2.546 -24.5,-2.546 -24.5,-2.046 -24.196,-2.046
  region: -22.5,-2.046 -24.5,-2.046 -24.5,-1.046 -22.5,-1.046
  region: -22.5,-1.046 -22.8,-1.046 -22.8,-0.546 -22.5,-0.546
  region: -22.5,-0.546 -24.5,-0.546 -24.5,3.754 -22.5,3.754
  region: -21,-3.546 -22,-3.546 -22,-1.046 -21,-1.046
  region: -22.5,-5.046 -24.5,-5.046 -24.5,-4.046 -22.5,-4.046
  region: 7.7,-5.796 6.7,-5.796 6.7,-4.896 7.7,-4.896
  region: 9.2,-5.796 8.2,-5.796 8.2,-4.896 9.2,-4.896
  region: 10.7,-5.796 9.7,-5.796 9.7,-4.896 10.7,-4.896
  region: 13.2,-5.796 11.2,-5.796 11.2,-4.896 13.2,-4.896
  region: 13.2,-4.896 6.7,-4.896 6.7,-4.596 13.2,-4.596
  region: 7.7,-4.596 6.7,-4.596 6.7,-3.746 7.7,-3.746
  region: 9.2,-4.596 8.2,-4.596 8.2,-3.746 9.2,-3.746
  region: 10.7,-4.596 9.7,-4.596 9.7,-3.746 10.7,-3.746
  region: 13.2,-4.596 11.2,-4.596 11.2,-3.746 13.2,-3.746
  region: 6.2,-5.796 5.2,-5.796 5.2,-3.746 6.2,-3.746
  region: 4.7,-5.796 3.7,-5.796 3.7,-3.746 4.7,-3.746
  region: -3.86,-7.996 -12.45,-7.996 -12.45,-5.996 -3.86,-5.996
  region: 24.752,-11.296 -24.648,-11.296 -24.65,-7.996 24.75,-7.996
Top Overlay:
  lines w0.2: -25.2,4.05 -25.2,-4.25 -24.575,-4.25 ; 24.675,-4.25 25.3,-4.25 25.3,4.05
Top Paste:
  region: 23.5,-3.746 21.7,-3.746 21.7,-2.546 23.5,-2.546
  region: 24.6,-2.546 21.7,-2.546 21.7,-0.546 24.6,-0.546
  region: 23.5,-0.546 21.7,-0.546 21.7,0.554 23.5,0.554
  region: 24.6,0.554 21.7,0.554 21.7,2.554 24.6,2.554
  region: 23.5,2.554 21.7,2.554 21.7,3.754 23.5,3.754
  region: 16.75,-3.746 14.35,-3.746 14.35,-2.546 16.75,-2.546
  region: -21.6,1.254 -24.5,1.254 -24.5,2.654 -21.6,2.654
  region: -21.6,2.654 -23.25,2.654 -23.25,3.737 -21.6,3.737
  region: -22.4,-0.846 -24.5,-0.846 -24.5,0.854 -22.4,0.854
  region: -21.6,-3.746 -24.5,-3.746 -24.5,-1.246 -21.6,-1.246
Top Solder:
  region: -3.67,-3.746 -6.4,-3.746 -6.4,-0.546 -3.67,-0.546
  region: -7.3,-3.746 -10.4,-3.746 -10.4,-0.596 -7.3,-0.596
  region: 16.75,-3.746 14.35,-3.746 14.35,-2.546 16.75,-2.546
  region: 23.5,2.554 21.7,2.554 21.7,3.754 23.5,3.754
  region: 24.6,0.554 21.7,0.554 21.7,2.554 24.6,2.554
  region: 23.5,-0.546 21.7,-0.546 21.7,0.554 23.5,0.554
  region: 24.6,-2.546 21.7,-2.546 21.7,-0.546 24.6,-0.546
  region: 23.5,-3.746 21.7,-3.746 21.7,-2.546 23.5,-2.546
  region: -21.6,-3.746 -24.5,-3.746 -24.5,-1.246 -21.6,-1.246
  region: -22.4,-0.846 -24.5,-0.846 -24.5,0.854 -22.4,0.854
  region: -21.6,2.654 -23.25,2.654 -23.25,3.737 -21.6,3.737
  region: -21.6,1.254 -24.5,1.254 -24.5,2.654 -21.6,2.654
Bottom Solder:
  region: -22.5,-2.046 -23.025,-2.046 -23.025,-1.446 -22.5,-1.446
  region: -21.48,-2.046 -22,-2.046 -22,-1.446 -21.48,-1.446
  region: -21.48,-3.146 -22,-3.146 -22,-2.546 -21.48,-2.546
  region: -22.5,-3.146 -23.025,-3.146 -23.025,-2.546 -22.5,-2.546
  region: -23.975,-1.646 -24.5,-1.646 -24.5,-1.046 -23.975,-1.046
  region: -23.975,-3.546 -24.5,-3.546 -24.5,-2.957 -23.975,-2.957
  region: -23.975,-4.646 -24.5,-4.646 -24.5,-4.046 -23.975,-4.046
  region: -23.975,-0.546 -24.5,-0.546 -24.5,0.054 -23.975,0.054
  region: 5.8,-5.796 5.2,-5.796 5.2,-5.276 5.8,-5.276
  region: 4.7,-5.796 4.1,-5.796 4.1,-5.276 4.7,-5.276
  region: 6.2,-4.266 5.6,-4.266 5.6,-3.746 6.2,-3.746
  region: 7.3,-4.266 6.7,-4.266 6.7,-3.746 7.3,-3.746
  region: 9.2,-4.271 8.6,-4.271 8.6,-3.746 9.2,-3.746
  region: 10.3,-4.271 9.7,-4.271 9.7,-3.746 10.3,-3.746
  region: 10.7,-5.796 10.1,-5.796 10.1,-5.271 10.7,-5.271
  region: 8.8,-5.796 8.2,-5.796 8.2,-5.271 8.8,-5.271
  region: 7.7,-5.796 7.1,-5.796 7.1,-5.271 7.7,-5.271
  region: 11.8,-5.796 11.2,-5.796 11.2,-5.271 11.8,-5.271
Mechanical 5:
  region: -10.45,-10.896 -10.97,-10.896 -10.97,-10.296 -10.45,-10.296
  region: -10.45,-9.796 -10.97,-9.796 -10.97,-9.196 -10.45,-9.196
  region: -10.45,-7.496 -10.97,-7.496 -10.97,-6.896 -10.45,-6.896
  region: -9.45,-10.896 -9.95,-10.896 -9.95,-10.296 -9.45,-10.296
  region: -8.45,-10.896 -8.95,-10.896 -8.95,-10.296 -8.45,-10.296
  region: -8.45,-9.796 -8.95,-9.796 -8.95,-9.196 -8.45,-9.196
  region: -9.45,-9.785 -9.95,-9.785 -9.95,-9.196 -9.45,-9.196
  region: -8.45,-7.496 -8.95,-7.496 -8.95,-6.896 -8.45,-6.896
  region: -9.45,-7.496 -9.95,-7.496 -9.95,-6.896 -9.45,-6.896
  region: -10.45,-8.596 -10.97,-8.596 -10.97,-7.996 -10.45,-7.996
  region: -9.45,-8.596 -9.95,-8.596 -9.95,-7.996 -9.45,-7.996
  region: -8.45,-8.596 -8.95,-8.596 -8.95,-7.996 -8.45,-7.996
Mechanical 7:
  lines w0.1: -24.95,-4.005 -24.95,4.004 25.05,4.004 25.05,-4.005 -24.95,-4.005
Mechanical 15:
  lines w0.254: -24.95,-4.005 25.05,-4.005 25.05,4.004 -24.95,4.004 -24.95,-4.005
Multi-Layer:
  pour cut-out: -39.95,5.08 39.05,5.08 39.05,-7.996 -39.95,-7.996
3D body: height 3.2, standoff 0, extent -24.95,-4 25.05,4

## P822602 [mm] "Flip 601"
pads (2):
  rect 2x2 smd: 1(8.89,-2.286) 2(5.08,-2.286)
via 7.05,-10.466 diameter 0.5 hole 0.25
via 11.84,-10.466 diameter 0.5 hole 0.25
via 7.05,-8.55 diameter 0.5 hole 0.25
via 11.84,-8.55 diameter 0.5 hole 0.25
via -12.7,-4.796 diameter 0.5 hole 0.25
via 23.85,3.254 diameter 0.5 hole 0.25
via 7.05,-6.746 diameter 0.5 hole 0.25
via 11.886,-6.746 diameter 0.5 hole 0.25
Top Layer:
  region: 10.45,-11.296 24.65,-11.296 24.65,-7.996 10.45,-7.996
  region: -24.75,-11.296 8.05,-11.296 8.05,-8.001 -24.75,-8.001
  region: 8.45,-10.496 8.95,-10.496 8.95,-10.296 8.45,-10.296
  region: 9.45,-10.496 9.95,-10.496 9.95,-10.296 9.45,-10.296
  region: 8.45,-10.696 9.95,-10.696 9.95,-10.496 8.45,-10.496
  region: 8.45,-10.896 8.95,-10.896 8.95,-10.696 8.45,-10.696
  region: 9.45,-10.896 9.95,-10.896 9.95,-10.696 9.45,-10.696
  region: 9.6,-11.296 9.8,-11.296 9.8,-10.896 9.6,-10.896
  region: 7.3,-3.796 10.4,-3.796 10.4,-0.596 7.3,-0.596
  region: 8.2,-5.696 9.2,-5.696 9.2,-3.796 8.2,-3.796
  region: 8.6,-6.896 8.8,-6.896 8.8,-5.696 8.6,-5.696
  region: 8.45,-7.096 8.95,-7.096 8.95,-6.896 8.45,-6.896
  region: 9.45,-7.096 9.95,-7.096 9.95,-6.896 9.45,-6.896
  region: 8.45,-7.296 9.95,-7.296 9.95,-7.096 8.45,-7.096
  region: 8.45,-7.496 8.95,-7.496 8.95,-7.296 8.45,-7.296
  region: 9.45,-7.496 9.95,-7.496 9.95,-7.296 9.45,-7.296
  region: 9.2,-6.496 12.45,-6.496 12.45,-5.996 9.2,-5.996
  region: 10.45,-7.996 12.45,-7.996 12.45,-6.496 10.45,-6.496
  region: 3.67,-3.826 6.399,-3.826 6.4,-0.566 3.67,-0.566
  region: 3.67,-5.996 5.71,-5.996 5.71,-3.826 3.67,-3.826
  region: 3.67,-7.991 8.05,-7.991 8.05,-5.996 3.67,-5.996
  region: -24.6,-2.046 -21.7,-2.046 -21.7,3.754 -24.6,3.754
  region: -24.6,-5.796 -12.05,-5.796 -12.05,-2.046 -24.6,-2.046
  region: 21.6,-3.746 24.5,-3.746 24.5,-1.246 21.6,-1.246
  region: 22.4,-0.846 24.5,-0.846 24.5,0.854 22.4,0.854
  region: 21.6,1.254 24.5,1.254 24.5,3.754 21.6,3.754
  region: 9.45,-9.796 9.95,-9.796 9.95,-9.596 9.45,-9.596
  region: 8.45,-9.796 8.95,-9.796 8.95,-9.596 8.45,-9.596
  region: 8.45,-9.596 9.95,-9.596 9.95,-9.396 8.45,-9.396
  region: 9.45,-9.396 9.95,-9.396 9.95,-9.196 9.45,-9.196
  region: 8.45,-9.396 8.95,-9.396 8.95,-9.196 8.45,-9.196
  region: 9.6,-9.196 9.8,-9.196 9.8,-8.596 9.6,-8.596
  region: 9.45,-8.596 9.95,-8.596 9.95,-8.396 9.45,-8.396
  region: 8.45,-8.596 8.95,-8.596 8.95,-8.396 8.45,-8.396
  region: 8.45,-8.396 9.95,-8.396 9.95,-8.196 8.45,-8.196
  region: 9.45,-8.196 9.95,-8.196 9.95,-7.996 9.45,-7.996
  region: 8.45,-8.196 8.95,-8.196 8.95,-7.996 8.45,-7.996
Bottom Layer:
  region: -24.752,-11.296 24.648,-11.296 24.65,-7.996 -24.75,-7.996
  region: 3.86,-7.996 12.45,-7.996 12.45,-5.996 3.86,-5.996
  region: -4.7,-5.796 -3.7,-5.796 -3.7,-3.746 -4.7,-3.746
  region: -6.2,-5.796 -5.2,-5.796 -5.2,-3.746 -6.2,-3.746
  region: -13.2,-4.596 -11.2,-4.596 -11.2,-3.746 -13.2,-3.746
  region: -10.7,-4.596 -9.7,-4.596 -9.7,-3.746 -10.7,-3.746
  region: -9.2,-4.596 -8.2,-4.596 -8.2,-3.746 -9.2,-3.746
  region: -7.7,-4.596 -6.7,-4.596 -6.7,-3.746 -7.7,-3.746
  region: -13.2,-4.896 -6.7,-4.896 -6.7,-4.596 -13.2,-4.596
  region: -13.2,-5.796 -11.2,-5.796 -11.2,-4.896 -13.2,-4.896
  region: -10.7,-5.796 -9.7,-5.796 -9.7,-4.896 -10.7,-4.896
  region: -9.2,-5.796 -8.2,-5.796 -8.2,-4.896 -9.2,-4.896
  region: -7.7,-5.796 -6.7,-5.796 -6.7,-4.896 -7.7,-4.896
  region: 22.5,-5.046 24.5,-5.046 24.5,-4.046 22.5,-4.046
  region: 21,-3.546 22,-3.546 22,-1.046 21,-1.046
  region: 22.5,-0.546 24.5,-0.546 24.5,3.754 22.5,3.754
  region: 22.5,-1.046 22.8,-1.046 22.8,-0.546 22.5,-0.546
  region: 22.5,-2.046 24.5,-2.046 24.5,-1.046 22.5,-1.046
  region: 24.196,-2.546 24.5,-2.546 24.5,-2.046 24.196,-2.046
  region: 22.5,-3.546 24.5,-3.546 24.5,-2.546 22.5,-2.546
Top Overlay:
  lines w0.2: -25.3,4.05 -25.3,-4.25 -24.675,-4.25 ; 24.575,-4.25 25.2,-4.25 25.2,4.05
Top Paste:
  region: 21.6,-3.746 24.5,-3.746 24.5,-1.246 21.6,-1.246
  region: 22.4,-0.846 24.5,-0.846 24.5,0.854 22.4,0.854
  region: 21.6,2.654 23.25,2.654 23.25,3.737 21.6,3.737
  region: 21.6,1.254 24.5,1.254 24.5,2.654 21.6,2.654
  region: -16.75,-3.746 -14.35,-3.746 -14.35,-2.546 -16.75,-2.546
  region: -23.5,2.554 -21.7,2.554 -21.7,3.754 -23.5,3.754
  region: -24.6,0.554 -21.7,0.554 -21.7,2.554 -24.6,2.554
  region: -23.5,-0.546 -21.7,-0.546 -21.7,0.554 -23.5,0.554
  region: -24.6,-2.546 -21.7,-2.546 -21.7,-0.546 -24.6,-0.546
  region: -23.5,-3.746 -21.7,-3.746 -21.7,-2.546 -23.5,-2.546
Top Solder:
  region: 21.6,1.254 24.5,1.254 24.5,2.654 21.6,2.654
  region: 21.6,2.654 23.25,2.654 23.25,3.737 21.6,3.737
  region: 22.4,-0.846 24.5,-0.846 24.5,0.854 22.4,0.854
  region: 21.6,-3.746 24.5,-3.746 24.5,-1.246 21.6,-1.246
  region: -23.5,-3.746 -21.7,-3.746 -21.7,-2.546 -23.5,-2.546
  region: -24.6,-2.546 -21.7,-2.546 -21.7,-0.546 -24.6,-0.546
  region: -23.5,-0.546 -21.7,-0.546 -21.7,0.554 -23.5,0.554
  region: -24.6,0.554 -21.7,0.554 -21.7,2.554 -24.6,2.554
  region: -23.5,2.554 -21.7,2.554 -21.7,3.754 -23.5,3.754
  region: -16.75,-3.746 -14.35,-3.746 -14.35,-2.546 -16.75,-2.546
  region: 7.3,-3.746 10.4,-3.746 10.4,-0.596 7.3,-0.596
  region: 3.67,-3.746 6.4,-3.746 6.4,-0.546 3.67,-0.546
Bottom Solder:
  region: -11.8,-5.796 -11.2,-5.796 -11.2,-5.271 -11.8,-5.271
  region: -7.7,-5.796 -7.1,-5.796 -7.1,-5.271 -7.7,-5.271
  region: -8.8,-5.796 -8.2,-5.796 -8.2,-5.271 -8.8,-5.271
  region: -10.7,-5.796 -10.1,-5.796 -10.1,-5.271 -10.7,-5.271
  region: -10.3,-4.271 -9.7,-4.271 -9.7,-3.746 -10.3,-3.746
  region: -9.2,-4.271 -8.6,-4.271 -8.6,-3.746 -9.2,-3.746
  region: -7.3,-4.266 -6.7,-4.266 -6.7,-3.746 -7.3,-3.746
  region: -6.2,-4.266 -5.6,-4.266 -5.6,-3.746 -6.2,-3.746
  region: -4.7,-5.796 -4.1,-5.796 -4.1,-5.276 -4.7,-5.276
  region: -5.8,-5.796 -5.2,-5.796 -5.2,-5.276 -5.8,-5.276
  region: 23.975,-0.546 24.5,-0.546 24.5,0.054 23.975,0.054
  region: 23.975,-4.646 24.5,-4.646 24.5,-4.046 23.975,-4.046
  region: 23.975,-3.546 24.5,-3.546 24.5,-2.957 23.975,-2.957
  region: 23.975,-1.646 24.5,-1.646 24.5,-1.046 23.975,-1.046
  region: 22.5,-3.146 23.025,-3.146 23.025,-2.546 22.5,-2.546
  region: 21.48,-3.146 22,-3.146 22,-2.546 21.48,-2.546
  region: 21.48,-2.046 22,-2.046 22,-1.446 21.48,-1.446
  region: 22.5,-2.046 23.025,-2.046 23.025,-1.446 22.5,-1.446
Mechanical 5:
  region: 8.45,-8.596 8.95,-8.596 8.95,-7.996 8.45,-7.996
  region: 9.45,-8.596 9.95,-8.596 9.95,-7.996 9.45,-7.996
  region: 10.45,-8.596 10.97,-8.596 10.97,-7.996 10.45,-7.996
  region: 9.45,-7.496 9.95,-7.496 9.95,-6.896 9.45,-6.896
  region: 8.45,-7.496 8.95,-7.496 8.95,-6.896 8.45,-6.896
  region: 9.45,-9.785 9.95,-9.785 9.95,-9.196 9.45,-9.196
  region: 8.45,-9.796 8.95,-9.796 8.95,-9.196 8.45,-9.196
  region: 8.45,-10.896 8.95,-10.896 8.95,-10.296 8.45,-10.296
  region: 9.45,-10.896 9.95,-10.896 9.95,-10.296 9.45,-10.296
  region: 10.45,-7.496 10.97,-7.496 10.97,-6.896 10.45,-6.896
  region: 10.45,-9.796 10.97,-9.796 10.97,-9.196 10.45,-9.196
  region: 10.45,-10.896 10.97,-10.896 10.97,-10.296 10.45,-10.296
Mechanical 7:
  lines w0.1: -25.05,-4.005 24.95,-4.005 24.95,4.004 -25.05,4.004 -25.05,-4.005
Mechanical 15:
  lines w0.254: -25.05,-4.005 -25.05,4.004 24.95,4.004 24.95,-4.005 -25.05,-4.005
Multi-Layer:
  pour cut-out: 39.95,5.08 -39.05,5.08 -39.05,-7.996 39.95,-7.996
3D body: height 3.2, standoff 0, extent -25.05,-4 24.95,4